# Altium footprint library mfmc_footprints.PcbLib: 156 footprints (part 7 of 10)
Each footprint in its own frame and in the unit in brackets; x right, y up, seen from the top. Pads: shape width x height; smd on the part's side, far side on the other; paste and mask are expansions set on the pad; w line width, h text height; cw(c..) or ccw(c..) is an arc to the next point about the centre after c.
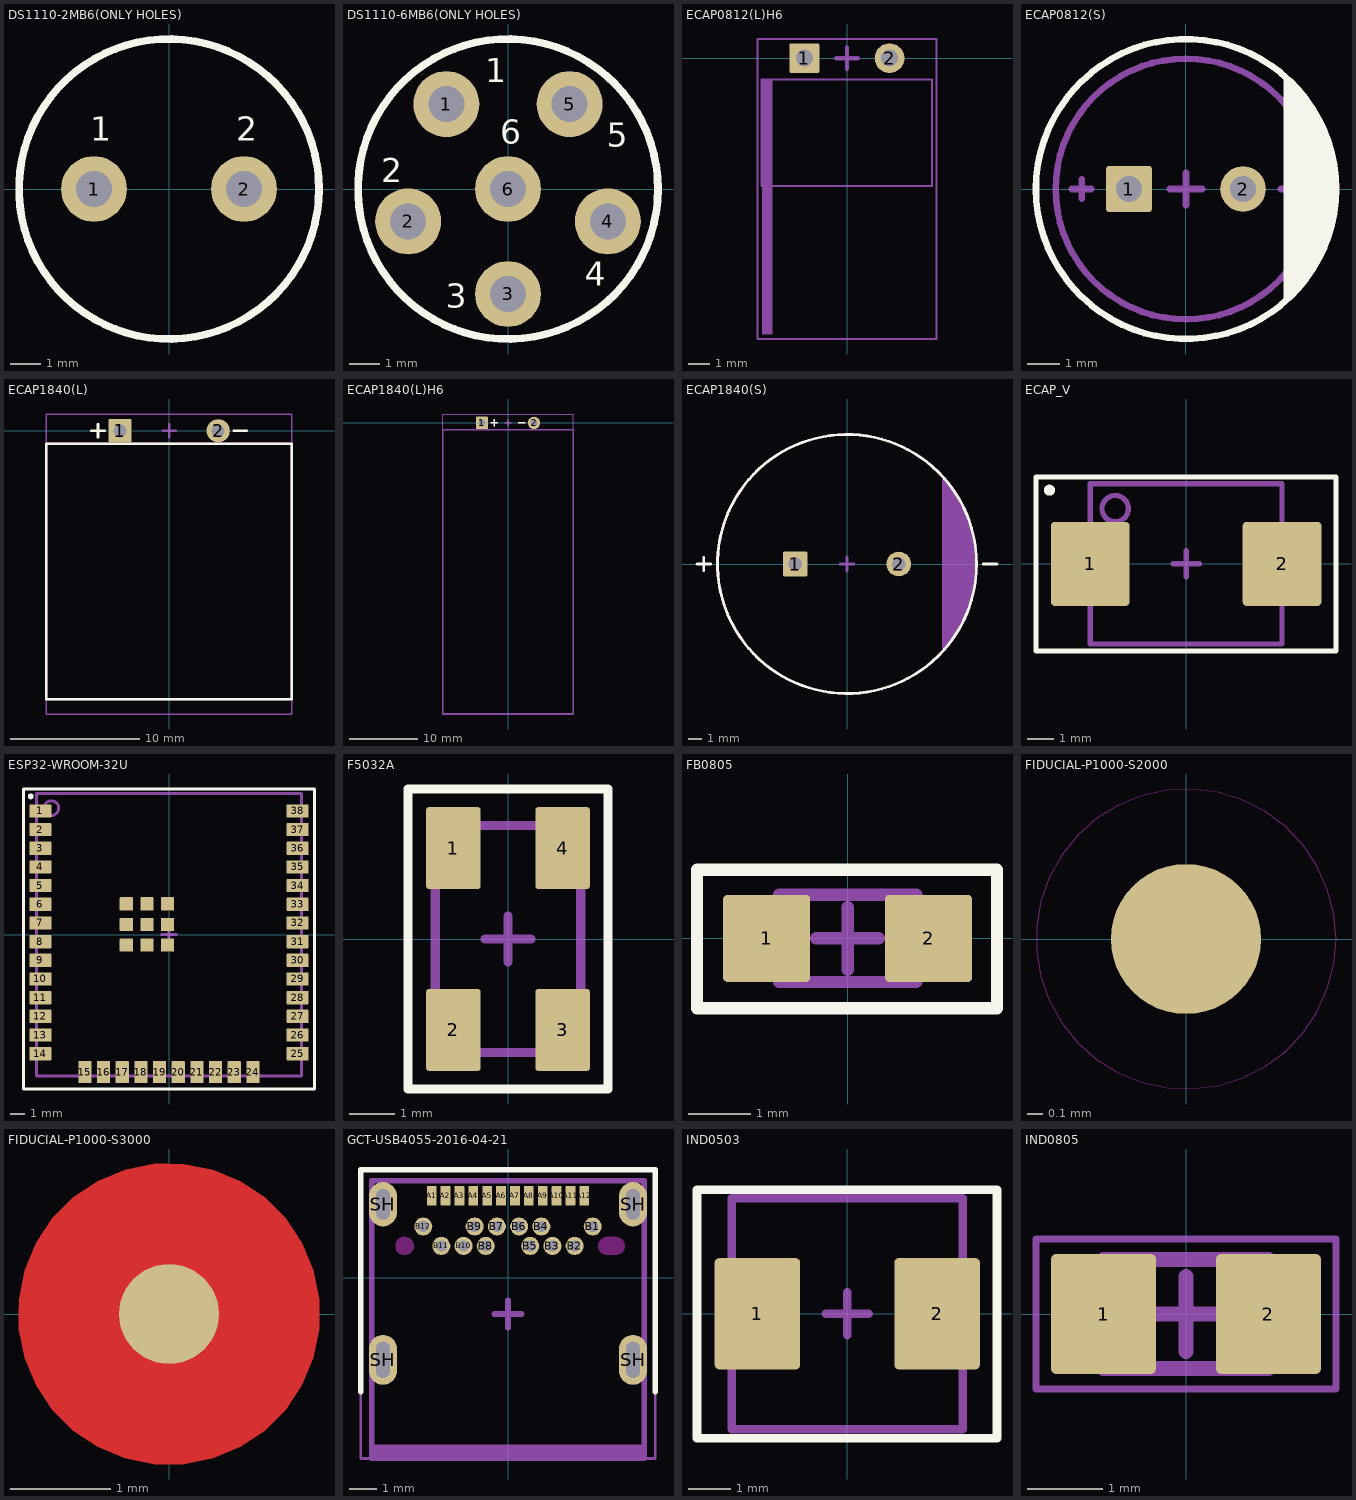
[diagram p6: the footprints below, top view; thin cyan lines are the x and y axes]

## DS1110-2MB6(ONLY HOLES) [mm] "Micro Jack Connection DS1110 Series"
pads (2):
  round 2.2 hole 1.2: 1(-2.5,0) 2(2.5,0)
Top Overlay:
  circle w0.254: c0,0 r5
  text "2" at 2.233,1.6 h0.8
  text "1" at -2.633,1.6 h0.8
Top Designator (Mech10):
  text ".Designator" at -7.618,-0.508 h1.52

## DS1110-6MB6(ONLY HOLES) [mm] "Micro Jack Connection DS1110 Series"
pads (6):
  round 2.2 hole 1.2: 1(-2.057,2.832) 2(-3.329,-1.082) 3(0,-3.5) 4(3.329,-1.082) 5(2.057,2.832) 6(0,0)
Top Overlay:
  circle w0.254: c0,0 r5
  text "6" at -0.267,1.5 h0.8
  text "5" at 3.297,1.416 h0.8
  text "4" at 2.562,-3.228 h0.8
  text "3" at -2.083,-3.964 h0.8
  text "2" at -4.217,0.226 h0.8
  text "1" at -0.759,3.551 h0.8
Top Designator (Mech10):
  text ".Designator" at -7.618,-0.508 h1.52

## ECAP0812(L)H6 [mm]
height 14
pads (2):
  rrect10% 1.4x1.4 hole 0.8: 1(-2,0)
  round 1.4 hole 0.8: 2(2,0)
Top Courtyard:
  lines w0.1: -4.2,-13.2 -4.2,0.9 4.2,0.9 4.2,-13.2 -4.2,-13.2
  lines w0.2: -0.5,0 0.5,0 ; 0,-0.5 0,0.5
Top Assembly:
  rectangle: -4,-13 -3.5,-1
  lines w0.1: -4.013,-6.013 4,-6.013 4,-1 -4.013,-1 -4.013,-6.013
Top Designator (Mech10):
  text ".Designator" at -7.618,-6.658 h1.52
3D body "ECAP0812(L).STEP": height 14, standoff 1, extent -4,-13 4,0.3

## ECAP0812(S) [mm] "Miniature Aluminum Electrolytic Capacitors D-8mm, H-11mm"
height 11
pads (2):
  rrect10% 1.4x1.4 hole 0.8: 1(-1.75,0)
  round 1.4 hole 0.8: 2(1.75,0)
Top Overlay:
  circle w0.2: c0,0 r4.6
  region: 3,-3.5 3,3.5 3.8,2.6 4.4,1.5 4.6,0.5 4.6,-0.6 4.2,-1.9 3.7,-2.8
Top Courtyard:
  circle w0.1: c0,0 r4.6
  lines w0.2: -0.5,0 0.5,0 ; 0,-0.5 0,0.5
Top Assembly:
  circle w0.2: c0,0 r4
  lines w0.2: -3.5,0 -2.9,0 ; -3.2,-0.3 -3.2,0.3 ; 2.9,0 3.5,0
Top Designator (Mech10):
  text ".Designator" at -7.618,-0.508 h1.52
3D body "ECAP0811(S).STEP": height 11, standoff -5, extent -4,-3.999 4,3.999

## ECAP1840(L) [mm]
height 19
pads (2):
  rrect10% 1.8x1.8 hole 1: 1(-3.8,0)
  round 1.8 hole 1: 2(3.8,0)
Top Overlay:
  lines w0.2: -6,0 -5,0 ; -5.5,-0.5 -5.5,0.5 ; 5,0 6,0 ; -9.513,-20.763 9.5,-20.763 9.5,-1 -9.513,-1 -9.513,-20.763
Top Courtyard:
  lines w0.1: -9.513,-21.913 9.5,-21.913 9.5,1.3 -9.513,1.3 -9.513,-21.913
  lines w0.2: -0.5,0 0.5,0 ; 0,-0.5 0,0.5
Top Assembly:
  lines w0.2: -9.513,-20.763 9.5,-20.763 9.5,-1 -9.513,-1 -9.513,-20.763
Top Designator (Mech10):
  text ".Designator" at -7.624,-21.333 h1.52
3D body "ECAP1840(L).STEP": height 19, standoff -4, extent -9.55,-43 9.45,0.4

## ECAP1840(L)H6 [mm]
height 25
pads (2):
  rrect10% 1.8x1.8 hole 1: 1(-3.8,0)
  round 1.8 hole 1: 2(3.8,0)
Top Overlay:
  lines w0.2: -2.5,0 -1.5,0 ; -2,-0.5 -2,0.5 ; 1.5,0 2.5,0
Top Courtyard:
  lines w0.1: -9.5,-42.5 -9.5,1.3 9.5,1.3 9.5,-42.5 -9.5,-42.5
  lines w0.2: -0.5,0 0.5,0 ; 0,-0.5 0,0.5
Top Assembly:
  lines w0.2: -9.5,-42.5 -9.5,-1 9.5,-1 9.5,-42.5 -9.5,-42.5
Top Designator (Mech10):
  text ".Designator" at -7.618,-21.333 h1.52
3D body "ECAP1840(L).STEP": height 25, standoff 2, extent -9.55,-43 9.45,0.4

## ECAP1840(S) [mm]
height 40
pads (2):
  rrect10% 1.8x1.8 hole 1: 1(-3.8,0)
  round 1.8 hole 1: 2(3.8,0)
Top Overlay:
  circle w0.2: c0,0 r9.5
  lines w0.2: -11,0 -10,0 ; -10.5,-0.5 -10.5,0.5 ; 10,0 11,0
Top Courtyard:
  circle w0.1: c0,0 r9.5
  lines w0.2: -0.5,0 0.5,0 ; 0,-0.5 0,0.5
Top Assembly:
  circle w0.2: c0,0 r9.5
  region: 6.978,-6.446 7.278,-6.121 7.815,-5.419 8.285,-4.67 8.682,-3.881 9.005,-3.058 9.25,-2.208 9.415,-1.34 9.499,-0.46 9.501,0.424 9.42,1.304 9.259,2.173 9.017,3.024 8.697,3.848 8.302,4.639 7.836,5.39 7.301,6.094 7.003,6.42 7.001,6.42
Top Designator (Mech10):
  text ".Designator" at -7.618,-0.508 h1.52
3D body "ECAP1840(S).STEP": height 41.5, standoff -5, extent -9.5,-9.499 9.5,9.499

## ECAP_V [mm] "Molded Capacitor, 2-Leads, Body 7,30x6,10mm, IPC Medium Density"
height 3.6
pads (2):
  rrect10% 3x3.2 smd: 1(-3.65,0) 2(3.65,0)
Top Overlay:
  circle w0.22: c-5.2,2.8 r0.1
  lines w0.2: -5.713,-3.313 5.7,-3.313 5.7,3.3 -5.713,3.3 -5.713,-3.313
Top Courtyard:
  lines w0.1: -5.7,-3.3 5.7,-3.3 5.7,3.3 -5.7,3.3 -5.7,-3.3
  lines w0.2: -0.5,0 0.5,0 ; 0,-0.5 0,0.5
Top Assembly:
  circle w0.2: c-2.7,2.1 r0.5
  lines w0.2: -3.65,-3.05 3.65,-3.05 3.65,3.05 -3.65,3.05 -3.65,-3.05
Top Designator (Mech10):
  text ".Designator" at -7.624,-0.514 h1.52
3D body "CAPMP7361X36N.step": height 3.6, standoff 0, extent -3.87,-3.05 3.87,3.05

## ESP32-WROOM-32U [mm]
height 3.2
pads (47):
  rrect10% 1.5x0.9 smd: 1(-8.75,8.41) 2(-8.75,7.14) 3(-8.75,5.87) 4(-8.75,4.6) 5(-8.75,3.33) 6(-8.75,2.06) 7(-8.75,0.79) 8(-8.75,-0.48) 9(-8.75,-1.75) 10(-8.75,-3.02) 11(-8.75,-4.29) 12(-8.75,-5.56) 13(-8.75,-6.83) 14(-8.75,-8.1) 25(8.75,-8.1) 26(8.75,-6.83) 27(8.75,-5.56) 28(8.75,-4.29) 29(8.75,-3.02) 30(8.75,-1.75) 31(8.75,-0.48) 32(8.75,0.79) 33(8.75,2.06) 34(8.75,3.33) 35(8.75,4.6) 36(8.75,5.87) 37(8.75,7.14) 38(8.75,8.41)
  rrect10% 0.9x1.5 smd: 15(-5.719,-9.35) 16(-4.449,-9.35) 17(-3.179,-9.35) 18(-1.909,-9.35) 19(-0.639,-9.35) 20(0.631,-9.35) 21(1.901,-9.35) 22(3.171,-9.35) 23(4.441,-9.35) 24(5.711,-9.35)
  rrect10% 0.9x0.9 smd: TP1(-2.9,2.09) TP2(-1.5,2.09) TP3(-0.1,2.09) TP4(-2.9,0.69) TP5(-1.5,0.69) TP6(-0.1,0.69) TP7(-2.9,-0.71) TP8(-1.5,-0.71) TP9(-0.1,-0.71)
Top Overlay:
  circle w0.2: c-9.4,9.4 r0.1
  lines w0.2: -9.9,-10.5 -9.9,9.9 9.9,9.9 9.9,-10.5 -9.9,-10.5
Top Courtyard:
  lines w0.1: -9.9,-10.5 -9.9,9.9 9.9,9.9 9.9,-10.5 -9.9,-10.5
  lines w0.2: -0.5,0 0.5,0 ; 0,-0.5 0,0.5
Top Assembly:
  circle w0.2: c-8,8.6 r0.5
  lines w0.2: -9.022,-9.622 9,-9.622 9,9.6 -9.022,9.6 -9.022,-9.622
Top Designator (Mech10):
  text ".Designator" at -7.618,-0.808 h1.52
3D body "ESP32-WROOM-32U.STEP": height 3.2, standoff 0, extent -9,-9.6 9,9.6

## F5032A [mm]
height 1.1
pads (4):
  rrect10% 1.2x1.8 smd: 1(-1.2,2) 2(-1.2,-2) 3(1.2,-2) 4(1.2,2)
Top Overlay:
  lines w0.2: -2.2,-3.3 2.2,-3.3 2.2,3.3 -2.2,3.3 -2.2,-3.3
Top Courtyard:
  lines w0.1: -2.2,-3.3 -2.2,3.3 2.2,3.3 2.2,-3.3 -2.2,-3.3
  lines w0.2: -0.5,0 0.5,0 ; 0,-0.5 0,0.5
Top Assembly:
  lines w0.2: -1.6,-2.5 1.6,-2.5 1.6,2.5 -1.6,2.5 -1.6,-2.5
Top Designator (Mech10):
  text ".Designator" at -7.618,-0.508 h1.52
3D body "step_temp.STEP": height 1.1, standoff 0, extent -1.6,-2.5 1.6,2.5

## FB0805 [mm] "Chip Inductor, 2-Leads, Body 2,00x1,20mm, IPC Medium Density"
height 1.1
pads (2):
  rrect10% 1.4x1.4 smd: 1(-1.3,0) 2(1.3,0)
Top Overlay:
  lines w0.2: -2.419,-1.119 2.4,-1.119 2.4,1.1 -2.419,1.1 -2.419,-1.119
Top Courtyard:
  lines w0.1: -2.4,-1.1 -2.4,1.1 2.4,1.1 2.4,-1.1 -2.4,-1.1
  lines w0.2: -0.5,0 0.5,0 ; 0,-0.5 0,0.5
Top Assembly:
  lines w0.2: -1.1,-0.7 1.1,-0.7 1.1,0.7 -1.1,0.7 -1.1,-0.7
Top Designator (Mech10):
  text ".Designator" at -7.627,-0.517 h1.52
3D body "INDC2012X11N.step": height 1.1, standoff 0, extent -1.1,-0.7 1.1,0.7

## FIDUCIAL-P1000-S2000 [mm]
pads (1):
  round 1 smd paste-2539.97 mask+0.5: ""(0,0)
Top Layer keep-out:
  circle w0.001: c0,0 r1
Top Designator (Mech10):
  text ".Designator" at -7.618,-0.508 h1.52

## FIDUCIAL-P1000-S3000 [mm]
pads (1):
  round 1 smd paste-2539.97 mask+1: ""(0,0)
Top Layer:
  pour cut-out: 0,-1.5 -0.148,-1.5 -0.438,-1.442 -0.711,-1.329 -0.956,-1.165 -1.165,-0.956 -1.329,-0.711 -1.442,-0.438 -1.5,-0.148 -1.5,0 -1.5,0.148 -1.442,0.438 -1.329,0.711 -1.165,0.956 -0.956,1.165 -0.711,1.329 -0.438,1.442 -0.148,1.5 0,1.5 0.148,1.5 0.438,1.442 0.711,1.329 0.956,1.165 1.165,0.956 1.329,0.711 1.442,0.438 1.5,0.148 1.5,0 1.5,-0.148 1.442,-0.438 1.329,-0.711 1.165,-0.956 0.956,-1.165 0.711,-1.329 0.438,-1.442 0.148,-1.5
Top Designator (Mech10):
  text ".Designator" at -7.618,-0.508 h1.52

## GCT-USB4055-2016-04-21 [mm] "Universal serial bus, Type-C, Female, Right angle, Black insulator, Tape & Reel"
height 3.42
pads (28):
  rrect10% 0.35x0.7 smd: A1(-2.75,2.955) A2(-2.25,2.955) A3(-1.75,2.955) A4(-1.25,2.955) A5(-0.75,2.955) A6(-0.25,2.955) A7(0.25,2.955) A8(0.75,2.955) A9(1.25,2.955) A10(1.75,2.955) A11(2.25,2.955) A12(2.75,2.955)
  round 0.65 hole 0.4: B1(3.05,1.845) B2(2.4,1.145) B3(1.6,1.145) B4(1.2,1.845) B5(0.8,1.145) B6(0.4,1.845) B7(-0.4,1.845) B8(-0.8,1.145) B9(-1.2,1.845) B10(-1.6,1.145) B11(-2.4,1.145) B12(-3.05,1.845)
  rrect100% 1x1.8 hole 0.5 slot 1.3 at 90 deg: SH(-4.5,-2.955) SH(4.5,-2.955)
  rrect100% 1x1.6 hole 0.5 slot 1.1 at 90 deg: SH(-4.5,2.645) SH(4.5,2.645)
Top Overlay:
  lines w0.2: -5.3,-4.105 -5.3,3.895 5.3,3.895 5.3,-4.105
Keep-Out Layer:
  board cut-out: -3.725,0.82 -3.79,0.82 -3.909,0.869 -4.001,0.961 -4.05,1.08 -4.05,1.145 -4.05,1.21 -4.001,1.329 -3.909,1.421 -3.79,1.47 -3.725,1.47 -3.66,1.47 -3.541,1.421 -3.449,1.329 -3.4,1.21 -3.4,1.145 -3.4,1.08 -3.449,0.961 -3.541,0.869 -3.66,0.82
  board cut-out: 3.575,0.82 3.51,0.82 3.391,0.869 3.299,0.961 3.25,1.08 3.25,1.21 3.299,1.329 3.391,1.421 3.51,1.47 3.575,1.47 3.875,1.47 3.94,1.47 4.059,1.421 4.151,1.329 4.2,1.21 4.2,1.08 4.151,0.961 4.059,0.869 3.94,0.82 3.875,0.82
Top Courtyard:
  lines w0.1: -5.3,-6.505 5.3,-6.505 5.3,3.895 -5.3,3.895 -5.3,-6.505
  lines w0.2: -0.5,-1.305 0.5,-1.305 ; 0,-1.805 0,-0.805
Top Assembly:
  rectangle: -4.9,-6.505 4.9,-6.005
  lines w0.2: -4.9,-6.505 4.9,-6.505 4.9,3.495 -4.9,3.495 -4.9,-6.505
Top Designator (Mech10):
  text ".Designator" at -7.618,-1.813 h1.52
3D body "usb4055-30-a.step": height 3.43, standoff -1.23, extent -4.856,-6.605 4.856,3.395

## IND0503 [mm]
height 3
pads (2):
  rrect10% 2x2.6 smd: 1(-2.1,0) 2(2.1,0)
Top Overlay:
  lines w0.2: -3.513,-2.913 3.5,-2.913 3.5,2.9 -3.513,2.9 -3.513,-2.913
Top Courtyard:
  lines w0.1: -3.5,-2.9 3.5,-2.9 3.5,2.9 -3.5,2.9 -3.5,-2.9
  lines w0.2: -0.5,0 0.5,0 ; 0,-0.5 0,0.5
Top Assembly:
  lines w0.2: -2.7,-2.7 2.7,-2.7 2.7,2.7 -2.7,2.7 -2.7,-2.7
Top Designator (Mech10):
  text ".Designator" at -7.624,-0.514 h1.52
3D body "SMD0530.STEP": height 3.05, standoff 0, extent -2.85,-2.7 2.85,2.7

## IND0805 [mm] "Chip Capacitor, 2-Leads, Body 2,00x1,25mm, IPC Medium Density"
height 1.45
pads (2):
  rrect10% 1.4x1.6 smd: 1(-1.1,0) 2(1.1,0)
Top Courtyard:
  lines w0.1: -2,-1 -2,1 2,1 2,-1 -2,-1
  lines w0.2: -0.5,0 0.5,0 ; 0,-0.5 0,0.5
Top Assembly:
  lines w0.2: -1.1,-0.725 1.1,-0.725 1.1,0.725 -1.1,0.725 -1.1,-0.725
Top Designator (Mech10):
  text ".Designator" at -7.618,-0.508 h1.52
3D body "CAPC2012X14N.step": height 1.45, standoff 0, extent -1.1,-0.725 1.1,0.725